# Altium footprint library SMDLibrary.PcbLib: 306 footprints (part 8 of 20)
Each footprint in its own frame and in the unit in brackets; x right, y up, seen from the top. Pads: shape width x height; smd on the part's side, far side on the other; paste and mask are expansions set on the pad; w line width, h text height; cw(c..) or ccw(c..) is an arc to the next point about the centre after c.
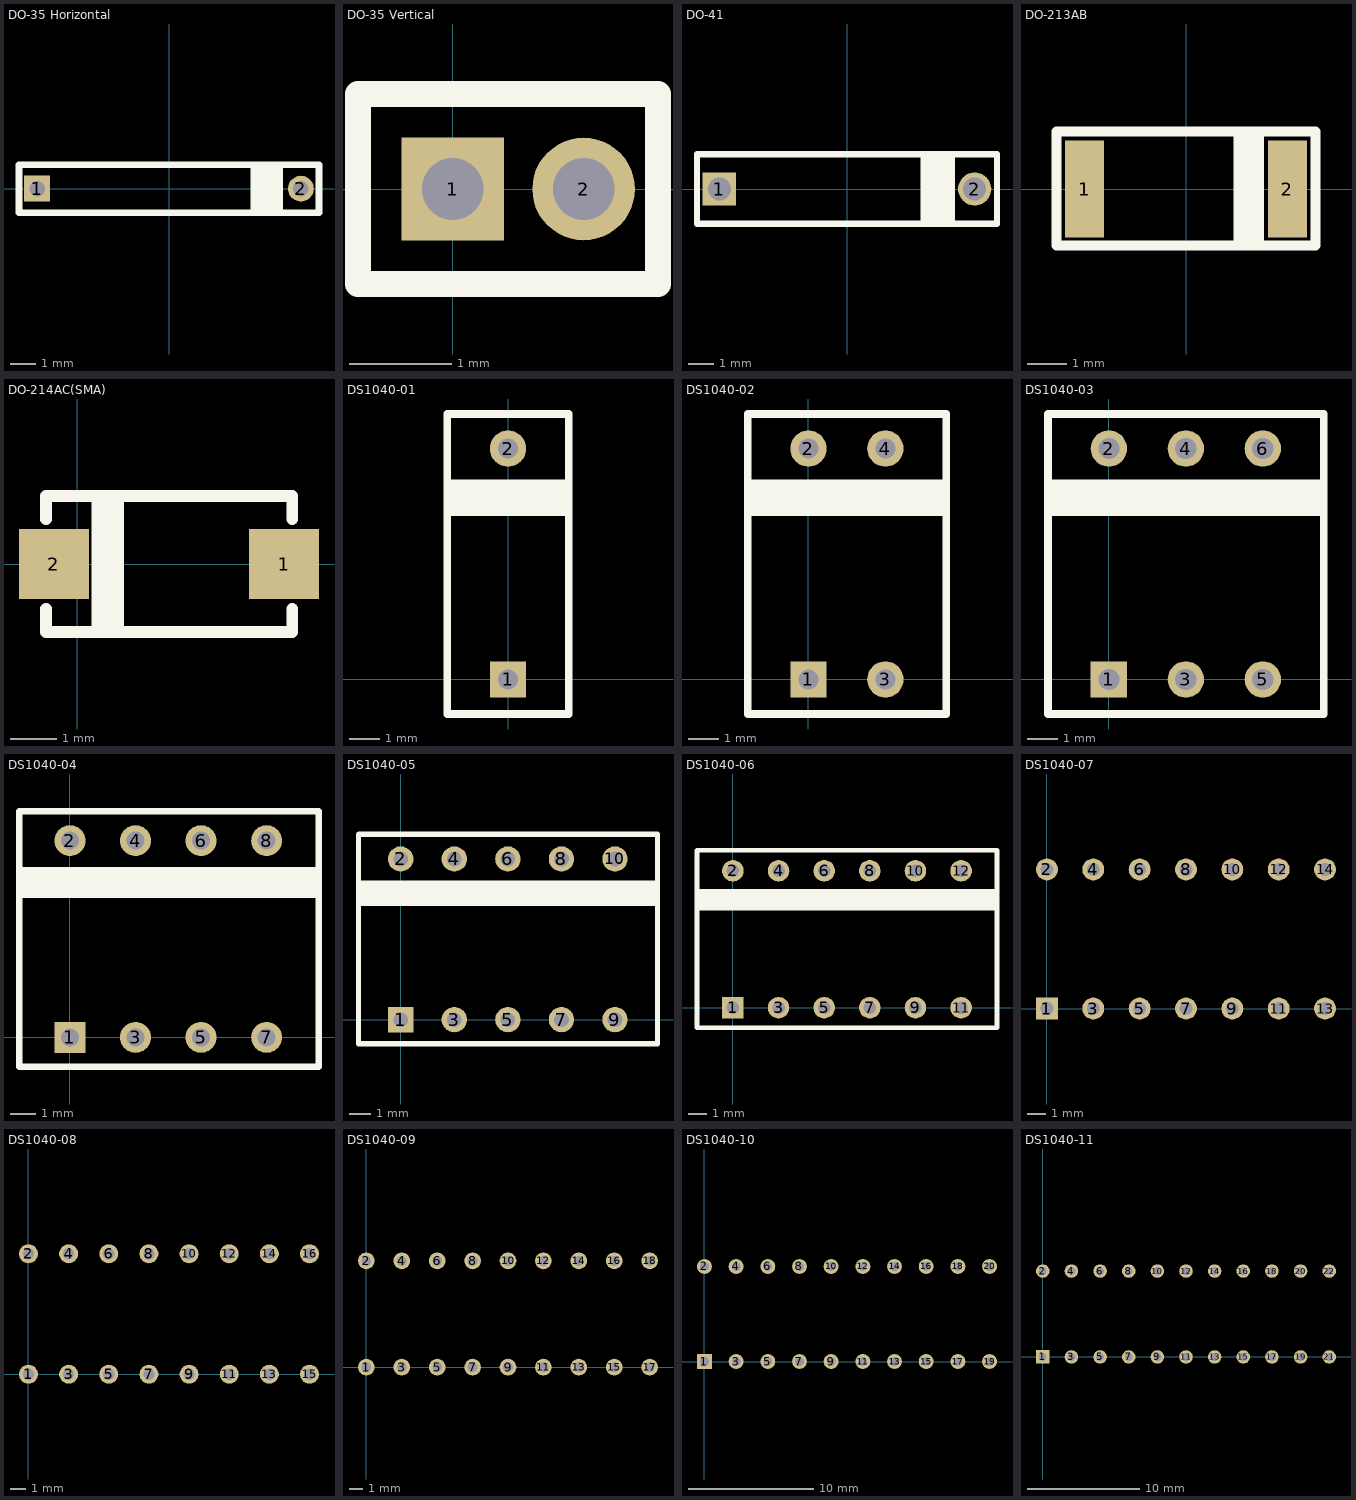
[diagram p7: the footprints below, top view; thin cyan lines are the x and y axes]

## DO-35 Horizontal [mm]
pads (2):
  rect 1x1 hole 0.6: 1(-5.1,0)
  round 1 hole 0.6: 2(5.1,0)
Top Overlay:
  rectangle: 3.15,-0.95 4.4,0.875
  region: 3.15,0.875
  lines w0.254: -5.8,-0.925 -5.8,0.925 5.8,0.925 5.8,-0.925 -5.8,-0.925
3D body "DO-35 Diode Horizontal.stp": height 1.53, standoff -3.54, extent -5.36,-0.925 5.36,0.925

## DO-35 Vertical [mm]
pads (2):
  rect 1x1 hole 0.6: 1(0,0)
  round 1 hole 0.6: 2(1.275,0)
Top Overlay:
  lines w0.254: -0.925,-0.925 -0.925,0.925 2,0.925 2,-0.925 -0.925,-0.925
3D body "DO-35 Diode Vertical 1.stp": height 5.66, standoff -3, extent -0.925,-0.924 1.55,0.926

## DO-41 [mm]
pads (2):
  rect 1.3x1.3 hole 0.9: 1(-5,0)
  round 1.3 hole 0.9: 2(5,0)
Top Overlay:
  rectangle: 2.875,-1.3 4.225,1.325
  lines w0.254: -5.875,-1.362 -5.875,1.363 5.875,1.363 5.875,-1.362 -5.875,-1.362
3D body "User Library-DO-41 10mm.STEP": height 3.36, standoff -2, extent -5.43,-1.362 5.43,1.363

## DO-213AB [mm]
pads (2):
  rect 1x2.5 smd: 1(-2.6,0) 2(2.6,0)
Top Overlay:
  rectangle: 1.225,-1.475 2,1.475
  lines w0.254: -3.325,-1.45 3.325,-1.45 3.325,1.475 -3.325,1.475 -3.325,-1.45
3D body "MelfDiode.stp": height 2.64, standoff 0.04, extent -2.6,-1.3 2.6,1.3

## DO-214AC(SMA) [mm]
pads (2):
  rect 1.5x1.5 smd: 1(4.43,0) 2(-0.5,0)
Top Overlay:
  rectangle: 0.3,-1.5 1,1.5
  lines w0.254: -0.675,-0.96 -0.675,-1.46 4.605,-1.46 4.605,-0.96 ; -0.675,0.96 -0.675,1.46 4.605,1.46 4.605,0.96
3D body "Diode SMA.stp": height 2.41, standoff 0, extent -0.675,-1.46 4.605,1.46

## DS1040-01 [mm]
pads (2):
  rect 1.2x1.2 hole 0.65: 1(0,0)
  round 1.2 hole 0.65: 2(0,7.62)
Top Overlay:
  rectangle: -2.025,5.4 2.025,6.6
  lines w0.254: -2,-1.14 2,-1.14 2,8.76 -2,8.76 -2,-1.14
3D body "DS1040-01 (DIP_switch).stp": height 6.8, standoff -3.85, extent -2,-1.14 2,8.76

## DS1040-02 [mm]
pads (4):
  rect 1.2x1.2 hole 0.65: 1(0,0)
  round 1.2 hole 0.65: 2(0,7.62) 3(2.54,0) 4(2.54,7.62)
Top Overlay:
  rectangle: -2,5.4 4.55,6.6
  lines w0.254: -2.005,-1.14 4.545,-1.14 4.545,8.76 -2.005,8.76 -2.005,-1.14
3D body "DS1040-02 (DIP_switch).stp": height 6.8, standoff -3.85, extent -2,-1.14 4.54,8.76

## DS1040-03 [mm]
pads (6):
  rect 1.2x1.2 hole 0.7: 1(0,0)
  round 1.2 hole 0.7: 2(0,7.62) 3(2.54,0) 4(2.54,7.62) 5(5.08,0) 6(5.08,7.62)
Top Overlay:
  rectangle: -2,5.4 7.1,6.6
  lines w0.254: -2.01,-1.14 -2.01,8.76 7.09,8.76 7.09,-1.14 -2.01,-1.14
3D body "DS1040-03 (DIP_switch).stp": height 6.8, standoff -3.85, extent -2,-1.14 7.08,8.76

## DS1040-04 [mm]
pads (8):
  rect 1.2x1.2 hole 0.7: 1(0,0)
  round 1.2 hole 0.7: 2(0,7.62) 3(2.54,0) 4(2.54,7.62) 5(5.08,0) 6(5.08,7.62) 7(7.62,0) 8(7.62,7.62)
Top Overlay:
  rectangle: -1.975,5.4 9.65,6.6
  lines w0.254: -1.965,-1.14 -1.965,8.76 9.635,8.76 9.635,-1.14 -1.965,-1.14
3D body "DS1040-04 (DIP_switch).stp": height 6.8, standoff -3.85, extent -2,-1.14 9.62,8.76

## DS1040-05 [mm]
pads (10):
  rect 1.2x1.2 hole 0.7: 1(0,0)
  round 1.2 hole 0.7: 2(0,7.62) 3(2.54,0) 4(2.54,7.62) 5(5.08,0) 6(5.08,7.62) 7(7.62,0) 8(7.62,7.62) 9(10.16,0) 10(10.16,7.62)
Top Overlay:
  rectangle: -2.025,5.4 12.2,6.6
  lines w0.254: -2,-1.15 -2,8.775 -1.975,8.8 12.175,8.8 12.175,-1.15 -2,-1.15
3D body "DS1040-05 (DIP_switch).stp": height 6.8, standoff -3.85, extent -2,-1.14 12.16,8.76

## DS1040-06 [mm]
pads (12):
  rect 1.2x1.2 hole 0.7: 1(0,0)
  round 1.2 hole 0.7: 2(0,7.62) 3(2.54,0) 4(2.54,7.62) 5(5.08,0) 6(5.08,7.62) 7(7.62,0) 8(7.62,7.62) 9(10.16,0) 10(10.16,7.62) 11(12.7,0) 12(12.7,7.62)
Top Overlay:
  rectangle: -2,5.4 14.7,6.6
  lines w0.254: -2,-1.125 -2,8.775 14.7,8.775 14.7,-1.125 -2,-1.125
3D body "DS1040-06 (DIP_switch).stp": height 6.8, standoff -3.85, extent -2,-1.14 14.7,8.76

## DS1040-07 [mm]
pads (14):
  rect 1.2x1.2 hole 0.7: 1(0,0)
  round 1.2 hole 0.7: 2(0,7.62) 3(2.54,0) 4(2.54,7.62) 5(5.08,0) 6(5.08,7.62) 7(7.62,0) 8(7.62,7.62) 9(10.16,0) 10(10.16,7.62) 11(12.7,0) 12(12.7,7.62) 13(15.24,0) 14(15.24,7.62)
3D body "DS1040-07 (DIP_switch).stp": height 6.8, standoff -3.85, extent -2,-1.14 17.24,8.76

## DS1040-08 [mm]
pads (16):
  round 1.2 hole 0.7: 1(0,0) 2(0,7.62) 3(2.54,0) 4(2.54,7.62) 5(5.08,0) 6(5.08,7.62) 7(7.62,0) 8(7.62,7.62) 9(10.16,0) 10(10.16,7.62) 11(12.7,0) 12(12.7,7.62) 13(15.24,0) 14(15.24,7.62) 15(17.78,0) 16(17.78,7.62)
3D body "DS1040-08 (DIP_switch).stp": height 6.8, standoff -3.85, extent -2,-1.14 19.78,8.76

## DS1040-09 [mm]
pads (18):
  round 1.2 hole 0.7: 1(0,0) 2(0,7.62) 3(2.54,0) 4(2.54,7.62) 5(5.08,0) 6(5.08,7.62) 7(7.62,0) 8(7.62,7.62) 9(10.16,0) 10(10.16,7.62) 11(12.7,0) 12(12.7,7.62) 13(15.24,0) 14(15.24,7.62) 15(17.78,0) 16(17.78,7.62) 17(20.32,0) 18(20.32,7.62)
3D body "DS1040-09 (DIP_switch).stp": height 6.8, standoff -3.85, extent -2,-1.14 22.32,8.76

## DS1040-10 [mm]
pads (20):
  rect 1.2x1.2 hole 0.7: 1(0,0)
  round 1.2 hole 0.7: 2(0,7.62) 3(2.54,0) 4(2.54,7.62) 5(5.08,0) 6(5.08,7.62) 7(7.62,0) 8(7.62,7.62) 9(10.16,0) 10(10.16,7.62) 11(12.7,0) 12(12.7,7.62) 13(15.24,0) 14(15.24,7.62) 15(17.78,0) 16(17.78,7.62) 17(20.32,0) 18(20.32,7.62) 19(22.86,0) 20(22.86,7.62)
3D body "DS1040-10 (DIP_switch).stp": height 6.8, standoff -3.85, extent -2,-1.14 24.86,8.76

## DS1040-11 [mm]
pads (22):
  rect 1.2x1.2 hole 0.7: 1(0,0)
  round 1.2 hole 0.7: 2(0,7.62) 3(2.54,0) 4(2.54,7.62) 5(5.08,0) 6(5.08,7.62) 7(7.62,0) 8(7.62,7.62) 9(10.16,0) 10(10.16,7.62) 11(12.7,0) 12(12.7,7.62) 13(15.24,0) 14(15.24,7.62) 15(17.78,0) 16(17.78,7.62) 17(20.32,0) 18(20.32,7.62) 19(22.86,0) 20(22.86,7.62) 21(25.4,0) 22(25.4,7.62)
3D body "DS1040-11 (DIP_switch).stp": height 6.8, standoff -3.85, extent -2,-1.14 27.4,8.76